# Altium integrated library esd_library.IntLib: 989 symbols (part 5 of 6) (continued)
## Resistor_196R (continued)
RES SMD 196R OHM 1% 1/8W 0805; MPN: CRCW0805196RFKEA; Name: Resistor_196R; PN: 541-196CCT-ND; URL: http://www.digikey.ca/product-detail/en/CRCW0805196RFKEA/541-196CCT-ND
footprint RESC2112X05M (Chip Resistor, 2-Leads, Body 2.05x1.25mm, IPC Low Density)
pins: 1, 2

## Resistor_200K
designator R?, comment Res3  value 200K
RES SMD 200K OHM 1% 1/8W 0805; MPN: CRCW0805200KFKEA; Name: Resistor_200K; PN: 541-200KCCT-ND; URL: http://www.digikey.ca/product-detail/en/CRCW0805200KFKEA/541-200KCCT-ND
footprint RESC2112X05M (Chip Resistor, 2-Leads, Body 2.05x1.25mm, IPC Low Density)
pins: 1, 2

## Resistor_200R
designator R?, comment Res3  value 200R
RES SMD 200R OHM 1% 1/8W 0805; MPN: CRCW0805200RFKEA; Name: Resistor_200R; PN: 541-200CCT-ND; URL: http://www.digikey.ca/product-detail/en/CRCW0805200RFKEA/541-200CCT-ND
footprint RESC2112X05M (Chip Resistor, 2-Leads, Body 2.05x1.25mm, IPC Low Density)
pins: 1, 2

## Resistor_205K
designator R?, comment Res3  value 205K
RES SMD 205K OHM 1% 1/8W 0805; MPN: CRCW0805205KFKEA; Name: Resistor_205K; PN: 541-205KCCT-ND; URL: http://www.digikey.ca/product-detail/en/CRCW0805205KFKEA/541-205KCCT-ND
footprint RESC2112X05M (Chip Resistor, 2-Leads, Body 2.05x1.25mm, IPC Low Density)
pins: 1, 2

## Resistor_205R
designator R?, comment Res3  value 205R
RES SMD 205R OHM 1% 1/8W 0805; MPN: CRCW0805205RFKEA; Name: Resistor_205R; PN: 541-205CCT-ND; URL: http://www.digikey.ca/product-detail/en/CRCW0805205RFKEA/541-205CCT-ND
footprint RESC2112X05M (Chip Resistor, 2-Leads, Body 2.05x1.25mm, IPC Low Density)
pins: 1, 2

## Resistor_210K
designator R?, comment Res3  value 210K
RES SMD 210K OHM 1% 1/8W 0805; MPN: CRCW0805210KFKEA; Name: Resistor_210K; PN: 541-210KCCT-ND; URL: http://www.digikey.ca/product-detail/en/CRCW0805210KFKEA/541-210KCCT-ND
footprint RESC2112X05M (Chip Resistor, 2-Leads, Body 2.05x1.25mm, IPC Low Density)
pins: 1, 2

## Resistor_210R
designator R?, comment Res3  value 210R
RES SMD 210R OHM 1% 1/8W 0805; MPN: CRCW0805210RFKEA; Name: Resistor_210R; PN: 541-210CCT-ND; URL: http://www.digikey.ca/product-detail/en/CRCW0805210RFKEA/541-210CCT-ND
footprint RESC2112X05M (Chip Resistor, 2-Leads, Body 2.05x1.25mm, IPC Low Density)
pins: 1, 2

## Resistor_216K
designator R?, comment Res3  value 216K
RES SMD 216K OHM 1% 1/8W 0805; MPN: CRCW0805216KFKEA; Name: Resistor_216K; PN: 541-216KCCT-ND; URL: http://www.digikey.ca/product-detail/en/CRCW0805216KFKEA/541-216KCCT-ND
footprint RESC2112X05M (Chip Resistor, 2-Leads, Body 2.05x1.25mm, IPC Low Density)
pins: 1, 2

## Resistor_216R
designator R?, comment Res3  value 216R
RES SMD 216R OHM 1% 1/8W 0805; MPN: CRCW0805216RFKEA; Name: Resistor_216R; PN: 541-216CCT-ND; URL: http://www.digikey.ca/product-detail/en/CRCW0805216RFKEA/541-216CCT-ND
footprint RESC2112X05M (Chip Resistor, 2-Leads, Body 2.05x1.25mm, IPC Low Density)
pins: 1, 2

## Resistor_221K
designator R?, comment Res3  value 221K
RES SMD 221K OHM 1% 1/8W 0805; MPN: CRCW0805221KFKEA; Name: Resistor_221K; PN: 541-221KCCT-ND; URL: http://www.digikey.ca/product-detail/en/CRCW0805221KFKEA/541-221KCCT-ND
footprint RESC2112X05M (Chip Resistor, 2-Leads, Body 2.05x1.25mm, IPC Low Density)
pins: 1, 2

## Resistor_221R
designator R?, comment Res3  value 221R
RES SMD 221R OHM 1% 1/8W 0805; MPN: CRCW0805221RFKEA; Name: Resistor_221R; PN: 541-221CCT-ND; URL: http://www.digikey.ca/product-detail/en/CRCW0805221RFKEA/541-221CCT-ND
footprint RESC2112X05M (Chip Resistor, 2-Leads, Body 2.05x1.25mm, IPC Low Density)
pins: 1, 2

## Resistor_226K
designator R?, comment Res3  value 226K
RES SMD 226K OHM 1% 1/8W 0805; MPN: CRCW0805226KFKEA; Name: Resistor_226K; PN: 541-226KCCT-ND; URL: http://www.digikey.ca/product-detail/en/CRCW0805226KFKEA/541-226KCCT-ND
footprint RESC2112X05M (Chip Resistor, 2-Leads, Body 2.05x1.25mm, IPC Low Density)
pins: 1, 2

## Resistor_226R
designator R?, comment Res3  value 226R
RES SMD 226R OHM 1% 1/8W 0805; MPN: CRCW0805226RFKEA; Name: Resistor_226R; PN: 541-226CCT-ND; URL: http://www.digikey.ca/product-detail/en/CRCW0805226RFKEA/541-226CCT-ND
footprint RESC2112X05M (Chip Resistor, 2-Leads, Body 2.05x1.25mm, IPC Low Density)
pins: 1, 2

## Resistor_232K
designator R?, comment Res3  value 232K
RES SMD 232K OHM 1% 1/8W 0805; MPN: CRCW0805232KFKEA; Name: Resistor_232K; PN: 541-232KCCT-ND; URL: http://www.digikey.ca/product-detail/en/CRCW0805232KFKEA/541-232KCCT-ND
footprint RESC2112X05M (Chip Resistor, 2-Leads, Body 2.05x1.25mm, IPC Low Density)
pins: 1, 2

## Resistor_232R
designator R?, comment Res3  value 232R
RES SMD 232R OHM 1% 1/8W 0805; MPN: CRCW0805232RFKEA; Name: Resistor_232R; PN: 541-232CCT-ND; URL: http://www.digikey.ca/product-detail/en/CRCW0805232RFKEA/541-232CCT-ND
footprint RESC2112X05M (Chip Resistor, 2-Leads, Body 2.05x1.25mm, IPC Low Density)
pins: 1, 2

## Resistor_237K
designator R?, comment Res3  value 237K
RES SMD 237K OHM 1% 1/8W 0805; MPN: CRCW0805237KFKEA; Name: Resistor_237K; PN: 541-237KCCT-ND; URL: http://www.digikey.ca/product-detail/en/CRCW0805237KFKEA/541-237KCCT-ND
footprint RESC2112X05M (Chip Resistor, 2-Leads, Body 2.05x1.25mm, IPC Low Density)
pins: 1, 2

## Resistor_237R
designator R?, comment Res3  value 237R
RES SMD 237R OHM 1% 1/8W 0805; MPN: CRCW0805237RFKEA; Name: Resistor_237R; PN: 541-237CCT-ND; URL: http://www.digikey.ca/product-detail/en/CRCW0805237RFKEA/541-237CCT-ND
footprint RESC2112X05M (Chip Resistor, 2-Leads, Body 2.05x1.25mm, IPC Low Density)
pins: 1, 2

## Resistor_243K
designator R?, comment Res3  value 243K
RES SMD 243K OHM 1% 1/8W 0805; MPN: CRCW0805243KFKEA; Name: Resistor_243K; PN: 541-243KCCT-ND; URL: http://www.digikey.ca/product-detail/en/CRCW0805243KFKEA/541-243KCCT-ND
footprint RESC2112X05M (Chip Resistor, 2-Leads, Body 2.05x1.25mm, IPC Low Density)
pins: 1, 2

## Resistor_243R
designator R?, comment Res3  value 243R
RES SMD 243R OHM 1% 1/8W 0805; MPN: CRCW0805243RFKEA; Name: Resistor_243R; PN: 541-243CCT-ND; URL: http://www.digikey.ca/product-detail/en/CRCW0805243RFKEA/541-243CCT-ND
footprint RESC2112X05M (Chip Resistor, 2-Leads, Body 2.05x1.25mm, IPC Low Density)
pins: 1, 2

## Resistor_249K
designator R?, comment Res3  value 249K
RES SMD 249K OHM 1% 1/8W 0805; MPN: CRCW0805249KFKEA; Name: Resistor_249K; PN: 541-249KCCT-ND; URL: http://www.digikey.ca/product-detail/en/CRCW0805249KFKEA/541-249KCCT-ND
footprint RESC2112X05M (Chip Resistor, 2-Leads, Body 2.05x1.25mm, IPC Low Density)
pins: 1, 2

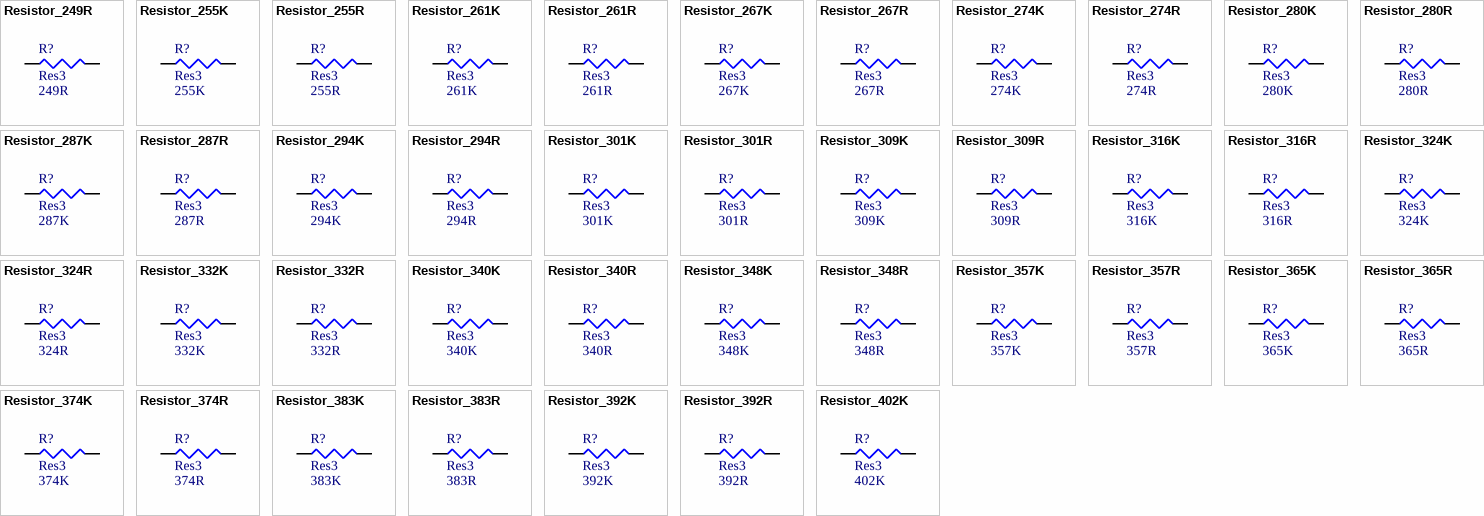
[diagram p24: symbols Resistor_249R to Resistor_402K]

## Resistor_249R
designator R?, comment Res3  value 249R
RES SMD 249R OHM 1% 1/8W 0805; MPN: CRCW0805249RFKEA; Name: Resistor_249R; PN: 541-249CCT-ND; URL: http://www.digikey.ca/product-detail/en/CRCW0805249RFKEA/541-249CCT-ND
footprint RESC2112X05M (Chip Resistor, 2-Leads, Body 2.05x1.25mm, IPC Low Density)
pins: 1, 2

## Resistor_255K
designator R?, comment Res3  value 255K
RES SMD 255K OHM 1% 1/8W 0805; MPN: CRCW0805255KFKEA; Name: Resistor_255K; PN: 541-255KCCT-ND; URL: http://www.digikey.ca/product-detail/en/CRCW0805255KFKEA/541-255KCCT-ND
footprint RESC2112X05M (Chip Resistor, 2-Leads, Body 2.05x1.25mm, IPC Low Density)
pins: 1, 2

## Resistor_255R
designator R?, comment Res3  value 255R
RES SMD 255R OHM 1% 1/8W 0805; MPN: CRCW0805255RFKEA; Name: Resistor_255R; PN: 541-255CCT-ND; URL: http://www.digikey.ca/product-detail/en/CRCW0805255RFKEA/541-255CCT-ND
footprint RESC2112X05M (Chip Resistor, 2-Leads, Body 2.05x1.25mm, IPC Low Density)
pins: 1, 2

## Resistor_261K
designator R?, comment Res3  value 261K
RES SMD 261K OHM 1% 1/8W 0805; MPN: CRCW0805261KFKEA; Name: Resistor_261K; PN: 541-261KCCT-ND; URL: http://www.digikey.ca/product-detail/en/CRCW0805261KFKEA/541-261KCCT-ND
footprint RESC2112X05M (Chip Resistor, 2-Leads, Body 2.05x1.25mm, IPC Low Density)
pins: 1, 2

## Resistor_261R
designator R?, comment Res3  value 261R
RES SMD 261R OHM 1% 1/8W 0805; MPN: CRCW0805261RFKEA; Name: Resistor_261R; PN: 541-261CCT-ND; URL: http://www.digikey.ca/product-detail/en/CRCW0805261RFKEA/541-261CCT-ND
footprint RESC2112X05M (Chip Resistor, 2-Leads, Body 2.05x1.25mm, IPC Low Density)
pins: 1, 2

## Resistor_267K
designator R?, comment Res3  value 267K
RES SMD 267K OHM 1% 1/8W 0805; MPN: CRCW0805267KFKEA; Name: Resistor_267K; PN: 541-267KCCT-ND; URL: http://www.digikey.ca/product-detail/en/CRCW0805267KFKEA/541-267KCCT-ND
footprint RESC2112X05M (Chip Resistor, 2-Leads, Body 2.05x1.25mm, IPC Low Density)
pins: 1, 2

## Resistor_267R
designator R?, comment Res3  value 267R
RES SMD 267R OHM 1% 1/8W 0805; MPN: CRCW0805267RFKEA; Name: Resistor_267R; PN: 541-267CCT-ND; URL: http://www.digikey.ca/product-detail/en/CRCW0805267RFKEA/541-267CCT-ND
footprint RESC2112X05M (Chip Resistor, 2-Leads, Body 2.05x1.25mm, IPC Low Density)
pins: 1, 2

## Resistor_274K
designator R?, comment Res3  value 274K
RES SMD 274K OHM 1% 1/8W 0805; MPN: CRCW0805274KFKEA; Name: Resistor_274K; PN: 541-274KCCT-ND; URL: http://www.digikey.ca/product-detail/en/CRCW0805274KFKEA/541-274KCCT-ND
footprint RESC2112X05M (Chip Resistor, 2-Leads, Body 2.05x1.25mm, IPC Low Density)
pins: 1, 2

## Resistor_274R
designator R?, comment Res3  value 274R
RES SMD 274R OHM 1% 1/8W 0805; MPN: CRCW0805274RFKEA; Name: Resistor_274R; PN: 541-274CCT-ND; URL: http://www.digikey.ca/product-detail/en/CRCW0805274RFKEA/541-274CCT-ND
footprint RESC2112X05M (Chip Resistor, 2-Leads, Body 2.05x1.25mm, IPC Low Density)
pins: 1, 2

## Resistor_280K
designator R?, comment Res3  value 280K
RES SMD 280K OHM 1% 1/8W 0805; MPN: CRCW0805280KFKEA; Name: Resistor_280K; PN: 541-280KCCT-ND; URL: http://www.digikey.ca/product-detail/en/CRCW0805280KFKEA/541-280KCCT-ND
footprint RESC2112X05M (Chip Resistor, 2-Leads, Body 2.05x1.25mm, IPC Low Density)
pins: 1, 2

## Resistor_280R
designator R?, comment Res3  value 280R
RES SMD 280R OHM 1% 1/8W 0805; MPN: CRCW0805280RFKEA; Name: Resistor_280R; PN: 541-280CCT-ND; URL: http://www.digikey.ca/product-detail/en/CRCW0805280RFKEA/541-280CCT-ND
footprint RESC2112X05M (Chip Resistor, 2-Leads, Body 2.05x1.25mm, IPC Low Density)
pins: 1, 2

## Resistor_287K
designator R?, comment Res3  value 287K
RES SMD 287K OHM 1% 1/8W 0805; MPN: CRCW0805287KFKEA; Name: Resistor_287K; PN: 541-287KCCT-ND; URL: http://www.digikey.ca/product-detail/en/CRCW0805287KFKEA/541-287KCCT-ND
footprint RESC2112X05M (Chip Resistor, 2-Leads, Body 2.05x1.25mm, IPC Low Density)
pins: 1, 2

## Resistor_287R
designator R?, comment Res3  value 287R
RES SMD 287R OHM 1% 1/8W 0805; MPN: CRCW0805287RFKEA; Name: Resistor_287R; PN: 541-287CCT-ND; URL: http://www.digikey.ca/product-detail/en/CRCW0805287RFKEA/541-287CCT-ND
footprint RESC2112X05M (Chip Resistor, 2-Leads, Body 2.05x1.25mm, IPC Low Density)
pins: 1, 2

## Resistor_294K
designator R?, comment Res3  value 294K
RES SMD 294K OHM 1% 1/8W 0805; MPN: CRCW0805294KFKEA; Name: Resistor_294K; PN: 541-294KCCT-ND; URL: http://www.digikey.ca/product-detail/en/CRCW0805294KFKEA/541-294KCCT-ND
footprint RESC2112X05M (Chip Resistor, 2-Leads, Body 2.05x1.25mm, IPC Low Density)
pins: 1, 2

## Resistor_294R
designator R?, comment Res3  value 294R
RES SMD 294R OHM 1% 1/8W 0805; MPN: CRCW0805294RFKEA; Name: Resistor_294R; PN: 541-294CCT-ND; URL: http://www.digikey.ca/product-detail/en/CRCW0805294RFKEA/541-294CCT-ND
footprint RESC2112X05M (Chip Resistor, 2-Leads, Body 2.05x1.25mm, IPC Low Density)
pins: 1, 2

## Resistor_301K
designator R?, comment Res3  value 301K
RES SMD 301K OHM 1% 1/8W 0805; MPN: CRCW0805301KFKEA; Name: Resistor_301K; PN: 541-301KCCT-ND; URL: http://www.digikey.ca/product-detail/en/CRCW0805301KFKEA/541-301KCCT-ND
footprint RESC2112X05M (Chip Resistor, 2-Leads, Body 2.05x1.25mm, IPC Low Density)
pins: 1, 2

## Resistor_301R
designator R?, comment Res3  value 301R
RES SMD 301R OHM 1% 1/8W 0805; MPN: CRCW0805301RFKEA; Name: Resistor_301R; PN: 541-301CCT-ND; URL: http://www.digikey.ca/product-detail/en/CRCW0805301RFKEA/541-301CCT-ND
footprint RESC2112X05M (Chip Resistor, 2-Leads, Body 2.05x1.25mm, IPC Low Density)
pins: 1, 2

## Resistor_309K
designator R?, comment Res3  value 309K
RES SMD 309K OHM 1% 1/8W 0805; MPN: CRCW0805309KFKEA; Name: Resistor_309K; PN: 541-309KCCT-ND; URL: http://www.digikey.ca/product-detail/en/CRCW0805309KFKEA/541-309KCCT-ND
footprint RESC2112X05M (Chip Resistor, 2-Leads, Body 2.05x1.25mm, IPC Low Density)
pins: 1, 2

## Resistor_309R
designator R?, comment Res3  value 309R
RES SMD 309R OHM 1% 1/8W 0805; MPN: CRCW0805309RFKEA; Name: Resistor_309R; PN: 541-309CCT-ND; URL: http://www.digikey.ca/product-detail/en/CRCW0805309RFKEA/541-309CCT-ND
footprint RESC2112X05M (Chip Resistor, 2-Leads, Body 2.05x1.25mm, IPC Low Density)
pins: 1, 2

## Resistor_316K
designator R?, comment Res3  value 316K
RES SMD 316K OHM 1% 1/8W 0805; MPN: CRCW0805316KFKEA; Name: Resistor_316K; PN: 541-316KCCT-ND; URL: http://www.digikey.ca/product-detail/en/CRCW0805316KFKEA/541-316KCCT-ND
footprint RESC2112X05M (Chip Resistor, 2-Leads, Body 2.05x1.25mm, IPC Low Density)
pins: 1, 2

## Resistor_316R
designator R?, comment Res3  value 316R
RES SMD 316R OHM 1% 1/8W 0805; MPN: CRCW0805316RFKEA; Name: Resistor_316R; PN: 541-316CCT-ND; URL: http://www.digikey.ca/product-detail/en/CRCW0805316RFKEA/541-316CCT-ND
footprint RESC2112X05M (Chip Resistor, 2-Leads, Body 2.05x1.25mm, IPC Low Density)
pins: 1, 2

## Resistor_324K
designator R?, comment Res3  value 324K
RES SMD 324K OHM 1% 1/8W 0805; MPN: CRCW0805324KFKEA; Name: Resistor_324K; PN: 541-324KCCT-ND; URL: http://www.digikey.ca/product-detail/en/CRCW0805324KFKEA/541-324KCCT-ND
footprint RESC2112X05M (Chip Resistor, 2-Leads, Body 2.05x1.25mm, IPC Low Density)
pins: 1, 2

## Resistor_324R
designator R?, comment Res3  value 324R
RES SMD 324R OHM 1% 1/8W 0805; MPN: CRCW0805324RFKEA; Name: Resistor_324R; PN: 541-324CCT-ND; URL: http://www.digikey.ca/product-detail/en/CRCW0805324RFKEA/541-324CCT-ND
footprint RESC2112X05M (Chip Resistor, 2-Leads, Body 2.05x1.25mm, IPC Low Density)
pins: 1, 2

## Resistor_332K
designator R?, comment Res3  value 332K
RES SMD 332K OHM 1% 1/8W 0805; MPN: CRCW0805332KFKEA; Name: Resistor_332K; PN: 541-332KCCT-ND; URL: http://www.digikey.ca/product-detail/en/CRCW0805332KFKEA/541-332KCCT-ND
footprint RESC2112X05M (Chip Resistor, 2-Leads, Body 2.05x1.25mm, IPC Low Density)
pins: 1, 2

## Resistor_332R
designator R?, comment Res3  value 332R
RES SMD 332R OHM 1% 1/8W 0805; MPN: CRCW0805332RFKEA; Name: Resistor_332R; PN: 541-332CCT-ND; URL: http://www.digikey.ca/product-detail/en/CRCW0805332RFKEA/541-332CCT-ND
footprint RESC2112X05M (Chip Resistor, 2-Leads, Body 2.05x1.25mm, IPC Low Density)
pins: 1, 2

## Resistor_340K
designator R?, comment Res3  value 340K
RES SMD 340K OHM 1% 1/8W 0805; MPN: CRCW0805340KFKEA; Name: Resistor_340K; PN: 541-340KCCT-ND; URL: http://www.digikey.ca/product-detail/en/CRCW0805340KFKEA/541-340KCCT-ND
footprint RESC2112X05M (Chip Resistor, 2-Leads, Body 2.05x1.25mm, IPC Low Density)
pins: 1, 2

## Resistor_340R
designator R?, comment Res3  value 340R
RES SMD 340R OHM 1% 1/8W 0805; MPN: CRCW0805340RFKEA; Name: Resistor_340R; PN: 541-340CCT-ND; URL: http://www.digikey.ca/product-detail/en/CRCW0805340RFKEA/541-340CCT-ND
footprint RESC2112X05M (Chip Resistor, 2-Leads, Body 2.05x1.25mm, IPC Low Density)
pins: 1, 2

## Resistor_348K
designator R?, comment Res3  value 348K
RES SMD 348K OHM 1% 1/8W 0805; MPN: CRCW0805348KFKEA; Name: Resistor_348K; PN: 541-348KCCT-ND; URL: http://www.digikey.ca/product-detail/en/CRCW0805348KFKEA/541-348KCCT-ND
footprint RESC2112X05M (Chip Resistor, 2-Leads, Body 2.05x1.25mm, IPC Low Density)
pins: 1, 2

## Resistor_348R
designator R?, comment Res3  value 348R
RES SMD 348R OHM 1% 1/8W 0805; MPN: CRCW0805348RFKEA; Name: Resistor_348R; PN: 541-348CCT-ND; URL: http://www.digikey.ca/product-detail/en/CRCW0805348RFKEA/541-348CCT-ND
footprint RESC2112X05M (Chip Resistor, 2-Leads, Body 2.05x1.25mm, IPC Low Density)
pins: 1, 2

## Resistor_357K
designator R?, comment Res3  value 357K
RES SMD 357K OHM 1% 1/8W 0805; MPN: CRCW0805357KFKEA; Name: Resistor_357K; PN: 541-357KCCT-ND; URL: http://www.digikey.ca/product-detail/en/CRCW0805357KFKEA/541-357KCCT-ND
footprint RESC2112X05M (Chip Resistor, 2-Leads, Body 2.05x1.25mm, IPC Low Density)
pins: 1, 2

## Resistor_357R
designator R?, comment Res3  value 357R
RES SMD 357R OHM 1% 1/8W 0805; MPN: CRCW0805357RFKEA; Name: Resistor_357R; PN: 541-357CCT-ND; URL: http://www.digikey.ca/product-detail/en/CRCW0805357RFKEA/541-357CCT-ND
footprint RESC2112X05M (Chip Resistor, 2-Leads, Body 2.05x1.25mm, IPC Low Density)
pins: 1, 2

## Resistor_365K
designator R?, comment Res3  value 365K
RES SMD 365K OHM 1% 1/8W 0805; MPN: CRCW0805365KFKEA; Name: Resistor_365K; PN: 541-365KCCT-ND; URL: http://www.digikey.ca/product-detail/en/CRCW0805365KFKEA/541-365KCCT-ND
footprint RESC2112X05M (Chip Resistor, 2-Leads, Body 2.05x1.25mm, IPC Low Density)
pins: 1, 2

## Resistor_365R
designator R?, comment Res3  value 365R
RES SMD 365R OHM 1% 1/8W 0805; MPN: CRCW0805365RFKEA; Name: Resistor_365R; PN: 541-365CCT-ND; URL: http://www.digikey.ca/product-detail/en/CRCW0805365RFKEA/541-365CCT-ND
footprint RESC2112X05M (Chip Resistor, 2-Leads, Body 2.05x1.25mm, IPC Low Density)
pins: 1, 2

## Resistor_374K
designator R?, comment Res3  value 374K
RES SMD 374K OHM 1% 1/8W 0805; MPN: CRCW0805374KFKEA; Name: Resistor_374K; PN: 541-374KCCT-ND; URL: http://www.digikey.ca/product-detail/en/CRCW0805374KFKEA/541-374KCCT-ND
footprint RESC2112X05M (Chip Resistor, 2-Leads, Body 2.05x1.25mm, IPC Low Density)
pins: 1, 2

## Resistor_374R
designator R?, comment Res3  value 374R
RES SMD 374R OHM 1% 1/8W 0805; MPN: CRCW0805374RFKEA; Name: Resistor_374R; PN: 541-374CCT-ND; URL: http://www.digikey.ca/product-detail/en/CRCW0805374RFKEA/541-374CCT-ND
footprint RESC2112X05M (Chip Resistor, 2-Leads, Body 2.05x1.25mm, IPC Low Density)
pins: 1, 2

## Resistor_383K
designator R?, comment Res3  value 383K
RES SMD 383K OHM 1% 1/8W 0805; MPN: CRCW0805383KFKEA; Name: Resistor_383K; PN: 541-383KCCT-ND; URL: http://www.digikey.ca/product-detail/en/CRCW0805383KFKEA/541-383KCCT-ND
footprint RESC2112X05M (Chip Resistor, 2-Leads, Body 2.05x1.25mm, IPC Low Density)
pins: 1, 2

## Resistor_383R
designator R?, comment Res3  value 383R
RES SMD 383R OHM 1% 1/8W 0805; MPN: CRCW0805383RFKEA; Name: Resistor_383R; PN: 541-383CCT-ND; URL: http://www.digikey.ca/product-detail/en/CRCW0805383RFKEA/541-383CCT-ND
footprint RESC2112X05M (Chip Resistor, 2-Leads, Body 2.05x1.25mm, IPC Low Density)
pins: 1, 2

## Resistor_392K
designator R?, comment Res3  value 392K
RES SMD 392K OHM 1% 1/8W 0805; MPN: CRCW0805392KFKEA; Name: Resistor_392K; PN: 541-392KCCT-ND; URL: http://www.digikey.ca/product-detail/en/CRCW0805392KFKEA/541-392KCCT-ND
footprint RESC2112X05M (Chip Resistor, 2-Leads, Body 2.05x1.25mm, IPC Low Density)
pins: 1, 2

## Resistor_392R
designator R?, comment Res3  value 392R
RES SMD 392R OHM 1% 1/8W 0805; MPN: CRCW0805392RFKEA; Name: Resistor_392R; PN: 541-392CCT-ND; URL: http://www.digikey.ca/product-detail/en/CRCW0805392RFKEA/541-392CCT-ND
footprint RESC2112X05M (Chip Resistor, 2-Leads, Body 2.05x1.25mm, IPC Low Density)
pins: 1, 2

## Resistor_402K
designator R?, comment Res3  value 402K
RES SMD 402K OHM 1% 1/8W 0805; MPN: CRCW0805402KFKEA; Name: Resistor_402K; PN: 541-402KCCT-ND; URL: http://www.digikey.ca/product-detail/en/CRCW0805402KFKEA/541-402KCCT-ND
footprint RESC2112X05M (Chip Resistor, 2-Leads, Body 2.05x1.25mm, IPC Low Density)
pins: 1, 2

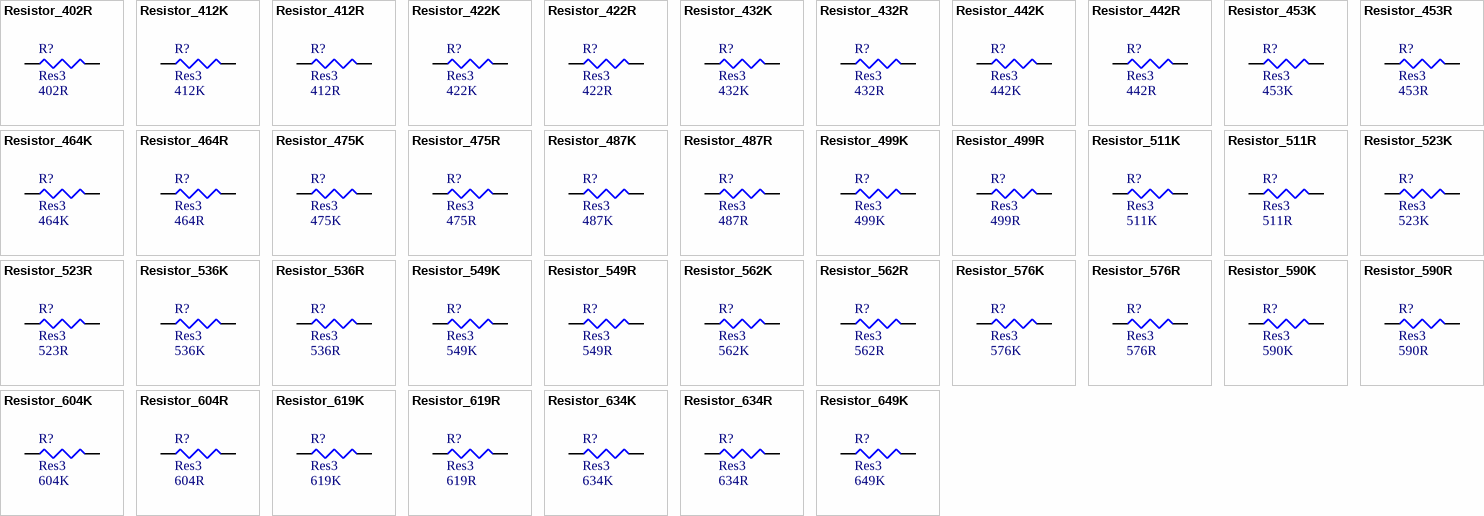
[diagram p25: symbols Resistor_402R to Resistor_649K]

## Resistor_402R
designator R?, comment Res3  value 402R
RES SMD 402R OHM 1% 1/8W 0805; MPN: CRCW0805402RFKEA; Name: Resistor_402R; PN: 541-402CCT-ND; URL: http://www.digikey.ca/product-detail/en/CRCW0805402RFKEA/541-402CCT-ND
footprint RESC2112X05M (Chip Resistor, 2-Leads, Body 2.05x1.25mm, IPC Low Density)
pins: 1, 2

## Resistor_412K
designator R?, comment Res3  value 412K
RES SMD 412K OHM 1% 1/8W 0805; MPN: CRCW0805412KFKEA; Name: Resistor_412K; PN: 541-412KCCT-ND; URL: http://www.digikey.ca/product-detail/en/CRCW0805412KFKEA/541-412KCCT-ND
footprint RESC2112X05M (Chip Resistor, 2-Leads, Body 2.05x1.25mm, IPC Low Density)
pins: 1, 2

## Resistor_412R
designator R?, comment Res3  value 412R
RES SMD 412R OHM 1% 1/8W 0805; MPN: CRCW0805412RFKEA; Name: Resistor_412R; PN: 541-412CCT-ND; URL: http://www.digikey.ca/product-detail/en/CRCW0805412RFKEA/541-412CCT-ND
footprint RESC2112X05M (Chip Resistor, 2-Leads, Body 2.05x1.25mm, IPC Low Density)
pins: 1, 2

## Resistor_422K
designator R?, comment Res3  value 422K
RES SMD 422K OHM 1% 1/8W 0805; MPN: CRCW0805422KFKEA; Name: Resistor_422K; PN: 541-422KCCT-ND; URL: http://www.digikey.ca/product-detail/en/CRCW0805422KFKEA/541-422KCCT-ND
footprint RESC2112X05M (Chip Resistor, 2-Leads, Body 2.05x1.25mm, IPC Low Density)
pins: 1, 2

## Resistor_422R
designator R?, comment Res3  value 422R
RES SMD 422R OHM 1% 1/8W 0805; MPN: CRCW0805422RFKEA; Name: Resistor_422R; PN: 541-422CCT-ND; URL: http://www.digikey.ca/product-detail/en/CRCW0805422RFKEA/541-422CCT-ND
footprint RESC2112X05M (Chip Resistor, 2-Leads, Body 2.05x1.25mm, IPC Low Density)
pins: 1, 2

## Resistor_432K
designator R?, comment Res3  value 432K
RES SMD 432K OHM 1% 1/8W 0805; MPN: CRCW0805432KFKEA; Name: Resistor_432K; PN: 541-432KCCT-ND; URL: http://www.digikey.ca/product-detail/en/CRCW0805432KFKEA/541-432KCCT-ND
footprint RESC2112X05M (Chip Resistor, 2-Leads, Body 2.05x1.25mm, IPC Low Density)
pins: 1, 2

## Resistor_432R
designator R?, comment Res3  value 432R
RES SMD 432R OHM 1% 1/8W 0805; MPN: CRCW0805432RFKEA; Name: Resistor_432R; PN: 541-432CCT-ND; URL: http://www.digikey.ca/product-detail/en/CRCW0805432RFKEA/541-432CCT-ND
footprint RESC2112X05M (Chip Resistor, 2-Leads, Body 2.05x1.25mm, IPC Low Density)
pins: 1, 2

## Resistor_442K
designator R?, comment Res3  value 442K
RES SMD 442K OHM 1% 1/8W 0805; MPN: CRCW0805442KFKEA; Name: Resistor_442K; PN: 541-442KCCT-ND; URL: http://www.digikey.ca/product-detail/en/CRCW0805442KFKEA/541-442KCCT-ND
footprint RESC2112X05M (Chip Resistor, 2-Leads, Body 2.05x1.25mm, IPC Low Density)
pins: 1, 2

## Resistor_442R
designator R?, comment Res3  value 442R
RES SMD 442R OHM 1% 1/8W 0805; MPN: CRCW0805442RFKEA; Name: Resistor_442R; PN: 541-442CCT-ND; URL: http://www.digikey.ca/product-detail/en/CRCW0805442RFKEA/541-442CCT-ND
footprint RESC2112X05M (Chip Resistor, 2-Leads, Body 2.05x1.25mm, IPC Low Density)
pins: 1, 2

## Resistor_453K
designator R?, comment Res3  value 453K
RES SMD 453K OHM 1% 1/8W 0805; MPN: CRCW0805453KFKEA; Name: Resistor_453K; PN: 541-453KCCT-ND; URL: http://www.digikey.ca/product-detail/en/CRCW0805453KFKEA/541-453KCCT-ND
footprint RESC2112X05M (Chip Resistor, 2-Leads, Body 2.05x1.25mm, IPC Low Density)
pins: 1, 2

## Resistor_453R
designator R?, comment Res3  value 453R
RES SMD 453R OHM 1% 1/8W 0805; MPN: CRCW0805453RFKEA; Name: Resistor_453R; PN: 541-453CCT-ND; URL: http://www.digikey.ca/product-detail/en/CRCW0805453RFKEA/541-453CCT-ND
footprint RESC2112X05M (Chip Resistor, 2-Leads, Body 2.05x1.25mm, IPC Low Density)
pins: 1, 2

## Resistor_464K
designator R?, comment Res3  value 464K
RES SMD 464K OHM 1% 1/8W 0805; MPN: CRCW0805464KFKEA; Name: Resistor_464K; PN: 541-464KCCT-ND; URL: http://www.digikey.ca/product-detail/en/CRCW0805464KFKEA/541-464KCCT-ND
footprint RESC2112X05M (Chip Resistor, 2-Leads, Body 2.05x1.25mm, IPC Low Density)
pins: 1, 2

## Resistor_464R
designator R?, comment Res3  value 464R
RES SMD 464R OHM 1% 1/8W 0805; MPN: CRCW0805464RFKEA; Name: Resistor_464R; PN: 541-464CCT-ND; URL: http://www.digikey.ca/product-detail/en/CRCW0805464RFKEA/541-464CCT-ND
footprint RESC2112X05M (Chip Resistor, 2-Leads, Body 2.05x1.25mm, IPC Low Density)
pins: 1, 2

## Resistor_475K
designator R?, comment Res3  value 475K
RES SMD 475K OHM 1% 1/8W 0805; MPN: CRCW0805475KFKEA; Name: Resistor_475K; PN: 541-475KCCT-ND; URL: http://www.digikey.ca/product-detail/en/CRCW0805475KFKEA/541-475KCCT-ND
footprint RESC2112X05M (Chip Resistor, 2-Leads, Body 2.05x1.25mm, IPC Low Density)
pins: 1, 2

## Resistor_475R
designator R?, comment Res3  value 475R
RES SMD 475R OHM 1% 1/8W 0805; MPN: CRCW0805475RFKEA; Name: Resistor_475R; PN: 541-475CCT-ND; URL: http://www.digikey.ca/product-detail/en/CRCW0805475RFKEA/541-475CCT-ND
footprint RESC2112X05M (Chip Resistor, 2-Leads, Body 2.05x1.25mm, IPC Low Density)
pins: 1, 2

## Resistor_487K
designator R?, comment Res3  value 487K
RES SMD 487K OHM 1% 1/8W 0805; MPN: CRCW0805487KFKEA; Name: Resistor_487K; PN: 541-487KCCT-ND; URL: http://www.digikey.ca/product-detail/en/CRCW0805487KFKEA/541-487KCCT-ND
footprint RESC2112X05M (Chip Resistor, 2-Leads, Body 2.05x1.25mm, IPC Low Density)
pins: 1, 2

## Resistor_487R
designator R?, comment Res3  value 487R
RES SMD 487R OHM 1% 1/8W 0805; MPN: CRCW0805487RFKEA; Name: Resistor_487R; PN: 541-487CCT-ND; URL: http://www.digikey.ca/product-detail/en/CRCW0805487RFKEA/541-487CCT-ND
footprint RESC2112X05M (Chip Resistor, 2-Leads, Body 2.05x1.25mm, IPC Low Density)
pins: 1, 2

## Resistor_499K
designator R?, comment Res3  value 499K
RES SMD 499K OHM 1% 1/8W 0805; MPN: CRCW0805499KFKEA; Name: Resistor_499K; PN: 541-499KCCT-ND; URL: http://www.digikey.ca/product-detail/en/CRCW0805499KFKEA/541-499KCCT-ND
footprint RESC2112X05M (Chip Resistor, 2-Leads, Body 2.05x1.25mm, IPC Low Density)
pins: 1, 2

## Resistor_499R
designator R?, comment Res3  value 499R
RES SMD 499R OHM 1% 1/8W 0805; MPN: CRCW0805499RFKEA; Name: Resistor_499R; PN: 541-499CCT-ND; URL: http://www.digikey.ca/product-detail/en/CRCW0805499RFKEA/541-499CCT-ND
footprint RESC2112X05M (Chip Resistor, 2-Leads, Body 2.05x1.25mm, IPC Low Density)
pins: 1, 2

## Resistor_511K
designator R?, comment Res3  value 511K
RES SMD 511K OHM 1% 1/8W 0805; MPN: CRCW0805511KFKEA; Name: Resistor_511K; PN: 541-511KCCT-ND; URL: http://www.digikey.ca/product-detail/en/CRCW0805511KFKEA/541-511KCCT-ND
footprint RESC2112X05M (Chip Resistor, 2-Leads, Body 2.05x1.25mm, IPC Low Density)
pins: 1, 2

## Resistor_511R
designator R?, comment Res3  value 511R
RES SMD 511R OHM 1% 1/8W 0805; MPN: CRCW0805511RFKEA; Name: Resistor_511R; PN: 541-511CCT-ND; URL: http://www.digikey.ca/product-detail/en/CRCW0805511RFKEA/541-511CCT-ND
footprint RESC2112X05M (Chip Resistor, 2-Leads, Body 2.05x1.25mm, IPC Low Density)
pins: 1, 2

## Resistor_523K
designator R?, comment Res3  value 523K
RES SMD 523K OHM 1% 1/8W 0805; MPN: CRCW0805523KFKEA; Name: Resistor_523K; PN: 541-523KCCT-ND; URL: http://www.digikey.ca/product-detail/en/CRCW0805523KFKEA/541-523KCCT-ND
footprint RESC2112X05M (Chip Resistor, 2-Leads, Body 2.05x1.25mm, IPC Low Density)
pins: 1, 2

## Resistor_523R
designator R?, comment Res3  value 523R
RES SMD 523R OHM 1% 1/8W 0805; MPN: CRCW0805523RFKEA; Name: Resistor_523R; PN: 541-523CCT-ND; URL: http://www.digikey.ca/product-detail/en/CRCW0805523RFKEA/541-523CCT-ND
footprint RESC2112X05M (Chip Resistor, 2-Leads, Body 2.05x1.25mm, IPC Low Density)
pins: 1, 2

## Resistor_536K
designator R?, comment Res3  value 536K
RES SMD 536K OHM 1% 1/8W 0805; MPN: CRCW0805536KFKEA; Name: Resistor_536K; PN: 541-536KCCT-ND; URL: http://www.digikey.ca/product-detail/en/CRCW0805536KFKEA/541-536KCCT-ND
footprint RESC2112X05M (Chip Resistor, 2-Leads, Body 2.05x1.25mm, IPC Low Density)
pins: 1, 2

## Resistor_536R
designator R?, comment Res3  value 536R
RES SMD 536R OHM 1% 1/8W 0805; MPN: CRCW0805536RFKEA; Name: Resistor_536R; PN: 541-536CCT-ND; URL: http://www.digikey.ca/product-detail/en/CRCW0805536RFKEA/541-536CCT-ND
footprint RESC2112X05M (Chip Resistor, 2-Leads, Body 2.05x1.25mm, IPC Low Density)
pins: 1, 2

## Resistor_549K
designator R?, comment Res3  value 549K
RES SMD 549K OHM 1% 1/8W 0805; MPN: CRCW0805549KFKEA; Name: Resistor_549K; PN: 541-549KCCT-ND; URL: http://www.digikey.ca/product-detail/en/CRCW0805549KFKEA/541-549KCCT-ND
footprint RESC2112X05M (Chip Resistor, 2-Leads, Body 2.05x1.25mm, IPC Low Density)
pins: 1, 2

## Resistor_549R
designator R?, comment Res3  value 549R
RES SMD 549R OHM 1% 1/8W 0805; MPN: CRCW0805549RFKEA; Name: Resistor_549R; PN: 541-549CCT-ND; URL: http://www.digikey.ca/product-detail/en/CRCW0805549RFKEA/541-549CCT-ND
footprint RESC2112X05M (Chip Resistor, 2-Leads, Body 2.05x1.25mm, IPC Low Density)
pins: 1, 2

## Resistor_562K
designator R?, comment Res3  value 562K
RES SMD 562K OHM 1% 1/8W 0805; MPN: CRCW0805562KFKEA; Name: Resistor_562K; PN: 541-562KCCT-ND; URL: http://www.digikey.ca/product-detail/en/CRCW0805562KFKEA/541-562KCCT-ND
footprint RESC2112X05M (Chip Resistor, 2-Leads, Body 2.05x1.25mm, IPC Low Density)
pins: 1, 2

## Resistor_562R
designator R?, comment Res3  value 562R
RES SMD 562R OHM 1% 1/8W 0805; MPN: CRCW0805562RFKEA; Name: Resistor_562R; PN: 541-562CCT-ND; URL: http://www.digikey.ca/product-detail/en/CRCW0805562RFKEA/541-562CCT-ND
footprint RESC2112X05M (Chip Resistor, 2-Leads, Body 2.05x1.25mm, IPC Low Density)
pins: 1, 2

## Resistor_576K
designator R?, comment Res3  value 576K
RES SMD 576K OHM 1% 1/8W 0805; MPN: CRCW0805576KFKEA; Name: Resistor_576K; PN: 541-576KCCT-ND; URL: http://www.digikey.ca/product-detail/en/CRCW0805576KFKEA/541-576KCCT-ND
footprint RESC2112X05M (Chip Resistor, 2-Leads, Body 2.05x1.25mm, IPC Low Density)
pins: 1, 2

## Resistor_576R
designator R?, comment Res3  value 576R
RES SMD 576R OHM 1% 1/8W 0805; MPN: CRCW0805576RFKEA; Name: Resistor_576R; PN: 541-576CCT-ND; URL: http://www.digikey.ca/product-detail/en/CRCW0805576RFKEA/541-576CCT-ND
footprint RESC2112X05M (Chip Resistor, 2-Leads, Body 2.05x1.25mm, IPC Low Density)
pins: 1, 2

## Resistor_590K
designator R?, comment Res3  value 590K
RES SMD 590K OHM 1% 1/8W 0805; MPN: CRCW0805590KFKEA; Name: Resistor_590K; PN: 541-590KCCT-ND; URL: http://www.digikey.ca/product-detail/en/CRCW0805590KFKEA/541-590KCCT-ND
footprint RESC2112X05M (Chip Resistor, 2-Leads, Body 2.05x1.25mm, IPC Low Density)
pins: 1, 2

## Resistor_590R
designator R?, comment Res3  value 590R
RES SMD 590R OHM 1% 1/8W 0805; MPN: CRCW0805590RFKEA; Name: Resistor_590R; PN: 541-590CCT-ND; URL: http://www.digikey.ca/product-detail/en/CRCW0805590RFKEA/541-590CCT-ND
footprint RESC2112X05M (Chip Resistor, 2-Leads, Body 2.05x1.25mm, IPC Low Density)
pins: 1, 2

## Resistor_604K
designator R?, comment Res3  value 604K
RES SMD 604K OHM 1% 1/8W 0805; MPN: CRCW0805604KFKEA; Name: Resistor_604K; PN: 541-604KCCT-ND; URL: http://www.digikey.ca/product-detail/en/CRCW0805604KFKEA/541-604KCCT-ND
footprint RESC2112X05M (Chip Resistor, 2-Leads, Body 2.05x1.25mm, IPC Low Density)
pins: 1, 2

## Resistor_604R
designator R?, comment Res3  value 604R
RES SMD 604R OHM 1% 1/8W 0805; MPN: CRCW0805604RFKEA; Name: Resistor_604R; PN: 541-604CCT-ND; URL: http://www.digikey.ca/product-detail/en/CRCW0805604RFKEA/541-604CCT-ND
footprint RESC2112X05M (Chip Resistor, 2-Leads, Body 2.05x1.25mm, IPC Low Density)
pins: 1, 2

## Resistor_619K
designator R?, comment Res3  value 619K
RES SMD 619K OHM 1% 1/8W 0805; MPN: CRCW0805619KFKEA; Name: Resistor_619K; PN: 541-619KCCT-ND; URL: http://www.digikey.ca/product-detail/en/CRCW0805619KFKEA/541-619KCCT-ND
footprint RESC2112X05M (Chip Resistor, 2-Leads, Body 2.05x1.25mm, IPC Low Density)
pins: 1, 2

## Resistor_619R
designator R?, comment Res3  value 619R
RES SMD 619R OHM 1% 1/8W 0805; MPN: CRCW0805619RFKEA; Name: Resistor_619R; PN: 541-619CCT-ND; URL: http://www.digikey.ca/product-detail/en/CRCW0805619RFKEA/541-619CCT-ND
footprint RESC2112X05M (Chip Resistor, 2-Leads, Body 2.05x1.25mm, IPC Low Density)
pins: 1, 2

## Resistor_634K
designator R?, comment Res3  value 634K
RES SMD 634K OHM 1% 1/8W 0805; MPN: CRCW0805634KFKEA; Name: Resistor_634K; PN: 541-634KCCT-ND; URL: http://www.digikey.ca/product-detail/en/CRCW0805634KFKEA/541-634KCCT-ND
footprint RESC2112X05M (Chip Resistor, 2-Leads, Body 2.05x1.25mm, IPC Low Density)
pins: 1, 2

## Resistor_634R
designator R?, comment Res3  value 634R
RES SMD 634R OHM 1% 1/8W 0805; MPN: CRCW0805634RFKEA; Name: Resistor_634R; PN: 541-634CCT-ND; URL: http://www.digikey.ca/product-detail/en/CRCW0805634RFKEA/541-634CCT-ND
footprint RESC2112X05M (Chip Resistor, 2-Leads, Body 2.05x1.25mm, IPC Low Density)
pins: 1, 2

## Resistor_649K
designator R?, comment Res3  value 649K
RES SMD 649K OHM 1% 1/8W 0805; MPN: CRCW0805649KFKEA; Name: Resistor_649K; PN: 541-649KCCT-ND; URL: http://www.digikey.ca/product-detail/en/CRCW0805649KFKEA/541-649KCCT-ND
footprint RESC2112X05M (Chip Resistor, 2-Leads, Body 2.05x1.25mm, IPC Low Density)
pins: 1, 2

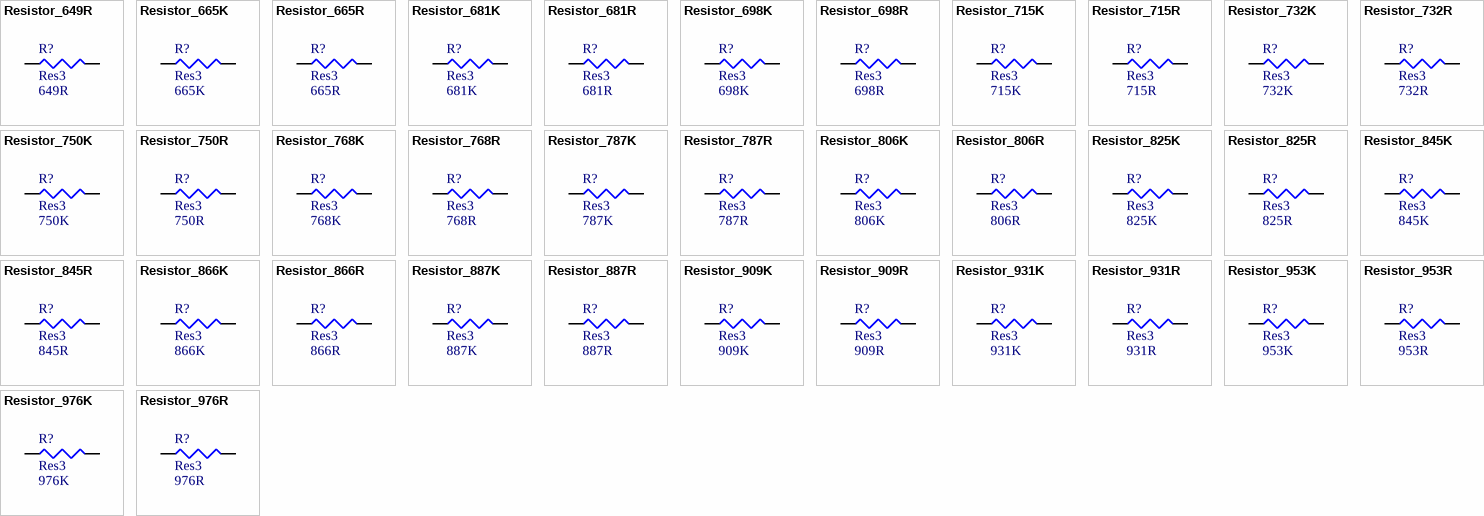
[diagram p26: symbols Resistor_649R to Resistor_976R]

## Resistor_649R
designator R?, comment Res3  value 649R
RES SMD 649R OHM 1% 1/8W 0805; MPN: CRCW0805649RFKEA; Name: Resistor_649R; PN: 541-649CCT-ND; URL: http://www.digikey.ca/product-detail/en/CRCW0805649RFKEA/541-649CCT-ND
footprint RESC2112X05M (Chip Resistor, 2-Leads, Body 2.05x1.25mm, IPC Low Density)
pins: 1, 2

## Resistor_665K
designator R?, comment Res3  value 665K
RES SMD 665K OHM 1% 1/8W 0805; MPN: CRCW0805665KFKEA; Name: Resistor_665K; PN: 541-665KCCT-ND; URL: http://www.digikey.ca/product-detail/en/CRCW0805665KFKEA/541-665KCCT-ND
footprint RESC2112X05M (Chip Resistor, 2-Leads, Body 2.05x1.25mm, IPC Low Density)
pins: 1, 2